# Altium footprint library Connector.PcbLib: 114 footprints (part 7 of 8)
Each footprint in its own frame and in the unit in brackets; x right, y up, seen from the top. Pads: shape width x height; smd on the part's side, far side on the other; paste and mask are expansions set on the pad; w line width, h text height; cw(c..) or ccw(c..) is an arc to the next point about the centre after c.
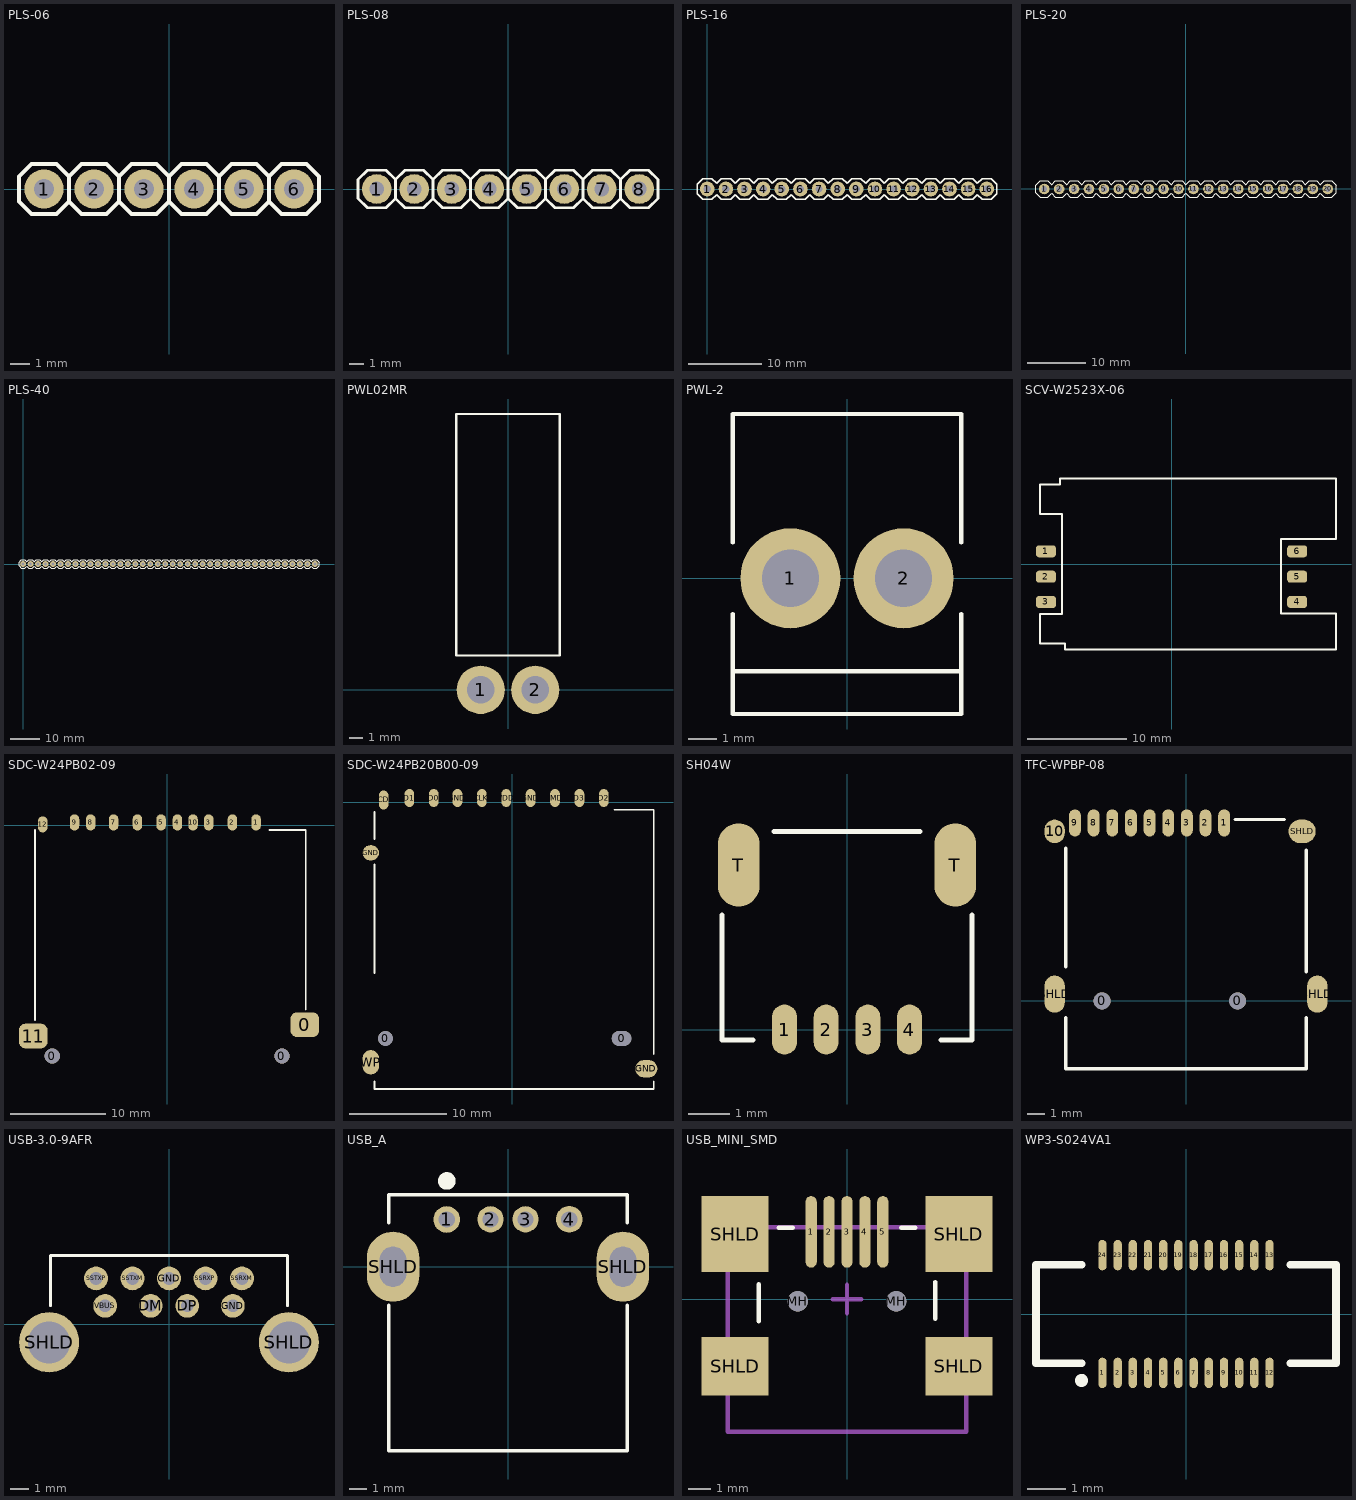
[diagram p6: the footprints below, top view; thin cyan lines are the x and y axes]

## PLS-06 [mm]
pads (6):
  round 2 hole 1: 1(-6.35,0) 2(-3.81,0) 3(-1.27,0) 4(1.27,0) 5(3.81,0) 6(6.35,0)
Top Overlay:
  lines w0.2: -5.08,-0.635 -4.445,-1.27 -3.175,-1.27 -2.54,-0.635 ; -5.08,-0.635 -5.08,0.635 ; -5.08,-0.635 -5.715,-1.27 -6.985,-1.27 -7.62,-0.635 -7.62,0.635 -6.985,1.27 -5.715,1.27 -5.08,0.635 ; -5.08,0.635 -4.445,1.27 -3.175,1.27 -2.54,0.635 ; -2.54,-0.635 -1.905,-1.27 -0.635,-1.27 0,-0.635 ; -2.54,-0.635 -2.54,0.635 ; -2.54,0.635 -1.905,1.27 -0.635,1.27 0,0.635 ; 0,-0.635 0.635,-1.27 1.905,-1.27 2.54,-0.635 ; 0,-0.635 0,0.635 ; 0,0.635 0.635,1.27 1.905,1.27 2.54,0.635 ; 2.54,-0.635 3.175,-1.27 4.445,-1.27 5.08,-0.635 ; 2.54,-0.635 2.54,0.635 ; 2.54,0.635 3.175,1.27 4.445,1.27 5.08,0.635 ; 5.08,-0.635 5.08,0.635 ; 5.08,-0.635 5.715,-1.27 6.985,-1.27 7.62,-0.635 7.62,0.635 6.985,1.27 5.715,1.27 5.08,0.635
3D body "PLS-06.STEP": height 8.45, standoff -2.99, extent -7.62,-1.27 7.62,1.27

## PLS-08 [mm]
pads (8):
  round 2 hole 1: 1(-8.89,0) 2(-6.35,0) 3(-3.81,0) 4(-1.27,0) 5(1.27,0) 6(3.81,0) 7(6.35,0) 8(8.89,0)
Top Overlay:
  lines w0.2: -7.62,-0.635 -6.985,-1.27 -5.715,-1.27 -5.08,-0.635 ; -7.62,-0.635 -7.62,0.635 ; -7.62,-0.635 -8.255,-1.27 -9.525,-1.27 -10.16,-0.635 -10.16,0.635 -9.525,1.27 -8.255,1.27 -7.62,0.635 ; -7.62,0.635 -6.985,1.27 -5.715,1.27 -5.08,0.635 ; -5.08,-0.635 -4.445,-1.27 -3.175,-1.27 -2.54,-0.635 ; -5.08,-0.635 -5.08,0.635 ; -5.08,0.635 -4.445,1.27 -3.175,1.27 -2.54,0.635 ; -2.54,-0.635 -1.905,-1.27 -0.635,-1.27 0,-0.635 ; -2.54,-0.635 -2.54,0.635 ; -2.54,0.635 -1.905,1.27 -0.635,1.27 0,0.635 ; 0,-0.635 0.635,-1.27 1.905,-1.27 2.54,-0.635 ; 0,-0.635 0,0.635 ; 0,0.635 0.635,1.27 1.905,1.27 2.54,0.635 ; 2.54,-0.635 2.54,0.635 ; 2.54,-0.635 3.175,-1.27 4.445,-1.27 5.08,-0.635 ; 2.54,0.635 3.175,1.27 4.445,1.27 5.08,0.635 ; 5.08,-0.635 5.715,-1.27 6.985,-1.27 7.62,-0.635 ; 5.08,-0.635 5.08,0.635 ; 5.08,0.635 5.715,1.27 6.985,1.27 7.62,0.635 ; 7.62,-0.635 8.255,-1.27 9.525,-1.27 10.16,-0.635 10.16,0.635 9.525,1.27 8.255,1.27 7.62,0.635 ; 7.62,-0.635 7.62,0.635

## PLS-16 [mm]
pads (16):
  round 2 hole 1: 1(0,0) 2(2.54,0) 3(5.08,0) 4(7.62,0) 5(10.16,0) 6(12.7,0) 7(15.24,0) 8(17.78,0) 9(20.32,0) 10(22.86,0) 11(25.4,0) 12(27.94,0) 13(30.48,0) 14(33.02,0) 15(35.56,0) 16(38.1,0)
Top Overlay:
  lines w0.2: -1.397,-0.635 -1.397,0.635 -0.635,1.397 0.635,1.397 1.27,0.762 1.905,1.397 3.175,1.397 3.81,0.762 4.445,1.397 5.715,1.397 6.35,0.762 6.985,1.397 8.255,1.397 8.89,0.762 9.525,1.397 10.795,1.397 11.43,0.762 12.065,1.397 13.335,1.397 13.97,0.762 14.605,1.397 15.875,1.397 16.51,0.762 17.145,1.397 18.415,1.397 19.05,0.762 19.685,1.397 20.955,1.397 21.59,0.762 22.225,1.397 23.495,1.397 24.13,0.762 24.765,1.397 26.035,1.397 26.67,0.762 27.305,1.397 28.575,1.397 29.21,0.762 29.845,1.397 31.115,1.397 31.75,0.762 32.385,1.397 33.655,1.397 34.29,0.762 34.925,1.397 36.195,1.397 36.83,0.762 37.465,1.397 38.735,1.397 39.497,0.635 39.497,-0.635 38.735,-1.397 37.465,-1.397 36.83,-0.762 36.195,-1.397 34.925,-1.397 34.29,-0.762 33.655,-1.397 32.385,-1.397 31.75,-0.762 31.115,-1.397 29.845,-1.397 29.21,-0.762 28.575,-1.397 27.305,-1.397 26.67,-0.762 26.035,-1.397 24.765,-1.397 24.13,-0.762 23.495,-1.397 22.225,-1.397 21.59,-0.762 20.955,-1.397 19.685,-1.397 19.05,-0.762 18.415,-1.397 17.145,-1.397 16.51,-0.762 15.875,-1.397 14.605,-1.397 13.97,-0.762 13.335,-1.397 12.065,-1.397 11.43,-0.762 10.795,-1.397 9.525,-1.397 8.89,-0.762 8.255,-1.397 6.985,-1.397 6.35,-0.762 5.715,-1.397 4.445,-1.397 3.81,-0.762 3.175,-1.397 1.905,-1.397 1.27,-0.762 0.635,-1.397 -0.635,-1.397 -1.397,-0.635
3D body "PLS-16.STEP": height 8.55, standoff -2.99, extent -1.27,-1.245 39.37,1.245

## PLS-20 [mm]
pads (20):
  round 1.8 hole 1: 1(-24.13,0) 2(-21.59,0) 3(-19.05,0) 4(-16.51,0) 5(-13.97,0) 6(-11.43,0) 7(-8.89,0) 8(-6.35,0) 9(-3.81,0) 10(-1.27,0) 11(1.27,0) 12(3.81,0) 13(6.35,0) 14(8.89,0) 15(11.43,0) 16(13.97,0) 17(16.51,0) 18(19.05,0) 19(21.59,0) 20(24.13,0)
Top Overlay:
  lines w0.2: -25.527,-0.635 -24.765,-1.397 -23.495,-1.397 -22.86,-0.762 -22.225,-1.397 -20.955,-1.397 -20.32,-0.762 -19.685,-1.397 -18.415,-1.397 -17.78,-0.762 -17.145,-1.397 -15.875,-1.397 -15.24,-0.762 -14.605,-1.397 -13.335,-1.397 -12.7,-0.762 -12.065,-1.397 -10.795,-1.397 -10.16,-0.762 -9.525,-1.397 -8.255,-1.397 -7.62,-0.762 -6.985,-1.397 -5.715,-1.397 -5.08,-0.762 -4.445,-1.397 -3.175,-1.397 -2.54,-0.762 -1.905,-1.397 -0.635,-1.397 0,-0.762 0.635,-1.397 1.905,-1.397 2.54,-0.762 3.175,-1.397 4.445,-1.397 5.08,-0.762 5.715,-1.397 6.985,-1.397 7.62,-0.762 8.255,-1.397 9.525,-1.397 10.16,-0.762 10.795,-1.397 12.065,-1.397 12.7,-0.762 13.335,-1.397 14.605,-1.397 15.24,-0.762 15.875,-1.397 17.145,-1.397 17.78,-0.762 18.415,-1.397 19.685,-1.397 20.32,-0.762 20.955,-1.397 22.225,-1.397 22.86,-0.762 23.495,-1.397 24.765,-1.397 25.527,-0.635 25.527,0.635 24.765,1.397 23.495,1.397 22.86,0.762 22.225,1.397 20.955,1.397 20.32,0.762 19.685,1.397 18.415,1.397 17.78,0.762 17.145,1.397 15.875,1.397 15.24,0.762 14.605,1.397 13.335,1.397 12.7,0.762 12.065,1.397 10.795,1.397 10.16,0.762 9.525,1.397 8.255,1.397 7.62,0.762 6.985,1.397 5.715,1.397 5.08,0.762 4.445,1.397 3.175,1.397 2.54,0.762 1.905,1.397 0.635,1.397 0,0.762 -0.635,1.397 -1.905,1.397 -2.54,0.762 -3.175,1.397 -4.445,1.397 -5.08,0.762 -5.715,1.397 -6.985,1.397 -7.62,0.762 -8.255,1.397 -9.525,1.397 -10.16,0.762 -10.795,1.397 -12.065,1.397 -12.7,0.762 -13.335,1.397 -14.605,1.397 -15.24,0.762 -15.875,1.397 -17.145,1.397 -17.78,0.762 -18.415,1.397 -19.685,1.397 -20.32,0.762 -20.955,1.397 -22.225,1.397 -22.86,0.762 -23.495,1.397 -24.765,1.397 -25.527,0.635 -25.527,-0.635

## PLS-40 [mm]
pads (40):
  round 2 hole 1: 1(0,0) 2(2.54,0) 3(5.08,0) 4(7.62,0) 5(10.16,0) 6(12.7,0) 7(15.24,0) 8(17.78,0) 9(20.32,0) 10(22.86,0) 11(25.4,0) 12(27.94,0) 13(30.48,0) 14(33.02,0) 15(35.56,0) 16(38.1,0) 17(40.64,0) 18(43.18,0) 19(45.72,0) 20(48.26,0) 21(50.8,0) 22(53.34,0) 23(55.88,0) 24(58.42,0) 25(60.96,0) 26(63.5,0) 27(66.04,0) 28(68.58,0) 29(71.12,0) 30(73.66,0) 31(76.2,0) 32(78.74,0) 33(81.28,0) 34(83.82,0) 35(86.36,0) 36(88.9,0) 37(91.44,0) 38(93.98,0) 39(96.52,0) 40(99.06,0)
Top Overlay:
  drawing of 242 lines, arcs and shapes, not listed

## PWL02MR [mm]
pads (2):
  round 3.5 hole 2: 1(-1.98,0) 2(1.98,0)
Top Overlay:
  lines w0.15: -3.75,2.5 3.75,2.5 3.75,20 -3.75,20 -3.75,2.5
3D body "026615020.stp": height 10.02, standoff -3.95, extent -3.886,-0.6 3.886,20.114

## PWL-2 [mm]
pads (2):
  round 3.5 hole 2: 1(-1.98,0) 2(1.98,0)
Top Overlay:
  lines w0.15: -4,-3.25 4,-3.25 ; -4,-1.25 -4,-4.75 4,-4.75 4,-1.25 ; -4,1.25 -4,5.75 4,5.75 4,1.25
3D body "User Library-PWL-2.step": height 13.81, standoff -3.59, extent -3.94,-4.8 3.98,5.6

## SCV-W2523X-06 [mm]
pads (6):
  rrect50% 2x1.2 smd: 1(-12.6,1.27) 2(-12.6,-1.27) 3(-12.6,-3.81) 4(12.6,-3.81) 5(12.6,-1.27) 6(12.6,1.27)
Top Overlay:
  lines w0.2: -13.2,-8 -10.668,-8 -10.668,-8.6 16.5,-8.6 16.5,-4.953 11,-4.953 11,2.5 16.5,2.5 16.5,8.6 -11.2,8.6 -11.2,8 -13.2,8 -13.2,5 -11,5 -11,-5 -13.2,-5 -13.2,-8
3D body: height 2.3, standoff 0, extent -13.2,-8.6 16.5,8.6

## SDC-W24PB02-09 [mm]
pads (15):
  round 1.6 hole 1.6 unplated mask+0: 0(-12.1,-24.3) 0(12.1,-24.3)
  rrect50% 3x2.6 smd mask+0.1: 0(14.5,-21) 11(-14.1,-22.2)
  oval 1x1.7 smd mask+0.1: 1(9.38,0.3) 2(6.88,0.3) 3(4.38,0.3) 4(1.08,0.3) 5(-0.63,0.3) 6(-3.13,0.3) 7(-5.63,0.3) 8(-8.05,0.3) 9(-9.75,0.3) 10(2.73,0.3) 12(-13.1,0.1)
Top Overlay:
  lines w0.2: -13.9,-20.5 -13.9,-0.5 ; 10.8,-0.5 14.6,-0.5 14.6,-19.4
3D body "SDC-W24PB02-09.STEP": height 2.77, standoff -0.98, extent -14.2,-35.75 15,0.25

## SDC-W24PB20B00-09 [mm]
pads (15):
  round 1.5 hole 1.5 unplated mask+0: 0(-13,-24.195)
  oval 2x1.5 hole 1.5 slot 2 at 0 deg unplated mask+0: 0(11.2,-24.195)
  oval 1x1.95 smd mask+0.1: CD(-13.18,0.25)
  oval 1x1.85 smd mask+0.1: CLK(-3.12,0.45) CMD(4.38,0.45) D0(-8.05,0.45) D1(-10.55,0.45) D2(9.38,0.45) D3(6.88,0.45) GND(-5.62,0.45) GND(1.88,0.45) VDD(-0.62,0.45)
  oval 1.7x1.55 smd mask+0.1: GND(-14.5,-5.165)
  oval 2.25x1.8 smd mask+0.1: GND(13.75,-27.3)
  oval 1.7x2.5 smd mask+0.1: WP(-14.5,-26.64)
Top Overlay:
  lines w0.2: -14.125,-28.6 -14.125,-29.375 14.5,-29.375 14.5,-28.6 ; -14.125,-17.5 -14.125,-6.375 ; -14.125,-3.75 -14.125,-1 ; 10.5,-0.75 14.5,-0.75 14.5,-25.8
3D body "SDC-W24PB20B-09.STEP": height 2.77, standoff -0.63, extent -14.47,-36.125 14.43,0.875

## SH04W [mm]
pads (6):
  oval 0.6x1.2 smd: 1(-1.5,0) 2(-0.5,0) 3(0.5,0) 4(1.5,0)
  oval 1x2 smd: T(-2.6,3.95) T(2.6,3.95)
Top Overlay:
  lines w0.12: -3,2.75 -3,-0.25 -2.25,-0.25 ; -1.75,4.75 1.75,4.75 ; 2.25,-0.25 3,-0.25 3,2.75
3D body "User Library-sh04w_asm.STEP": height 3.15, standoff 0.01, extent -3,-0.23 3,4.73

## TFC-WPBP-08 [mm]
height 1.85
pads (15):
  round 1 hole 1 unplated mask+0.1: 0(-4.95,0) 0(3.05,0)
  oval 0.7x1.6 smd mask+0.1: 1(2.25,10.5) 2(1.15,10.5) 3(0.05,10.5) 4(-1.05,10.5) 5(-2.15,10.5) 6(-3.25,10.5) 7(-4.35,10.5) 8(-5.45,10.5) 9(-6.55,10.5)
  oval 1.2x1.4 smd mask+0.1: 10(-7.75,10)
  oval 1.2x2.2 smd mask+0.1: SHLD(-7.75,0.4) SHLD(7.75,0.4)
  oval 1.6x1.4 smd mask+0.1: SHLD(6.85,10)
Top Overlay:
  lines w0.2: -7.1,-1 -7.1,-4 7.1,-4 7.1,-1 ; -7.1,2 -7.1,9 ; 2.9,10.7 5.8,10.7 ; 7.1,1.7 7.1,8.9
3D body "TFC-WPBP-08.STEP": height 1.87, standoff -0.58, extent -7.075,-6.2 7.075,10.7

## USB-3.0-9AFR [mm]
pads (11):
  round 1.3 hole 0.7: DM(-1,1) DP(1,1) GND(0,2.5) GND(3.5,1) SSRXM(4,2.5) SSRXP(2,2.5) SSTXM(-2,2.5) SSTXP(-4,2.5) VBUS(-3.5,1)
  round 3.3 hole 2.3: SHLD(-6.57,-1) SHLD(6.57,-1)
Top Overlay:
  lines w0.15: -6.5,1 -6.5,3.75 6.5,3.75 6.5,1
3D body "STEP-692121030100-rev1.stp": height 8, standoff -3.22, extent -7.74,-12.8 7.74,3.75

## USB_A [mm]
pads (6):
  round 1.524 hole 0.92 mask+0: 1(-3.5,2.7) 4(3.5,2.71)
  round 1.5 hole 0.92 mask+0: 2(-1,2.71) 3(1,2.71)
  oval 3x4 hole 1.5 slot 2.3 at 90 deg mask+0: SHLD(-6.57,0) SHLD(6.57,0)
Top Overlay:
  circle w0.6: c-3.5,4.9 r0.2
  lines w0.2: -6.8,-2.2 -6.8,-10.5 6.8,-10.5 6.8,-2.2 ; -6.8,2.5 -6.8,4.1 6.8,4.1 6.8,2.5
3D body "USB-A.STEP": height 6.97, standoff -4.18, extent -7.915,-10.516 7.885,3.184

## USB_MINI_SMD [mm]
pads (11):
  oval 0.5x3.2 smd: 1(-1.6,3) 2(-0.8,3) 3(0,3) 4(0.8,3) 5(1.6,3)
  round 0.9 hole 0.9 unplated: MH(-2.2,-0.1) MH(2.2,-0.1)
  rect 3x2.6 smd: SHLD(-5,-3) SHLD(5,-3)
  rect 3x3.4 smd: SHLD(-5,2.9) SHLD(5,2.9)
Top Overlay:
  lines w0.2: -3.937,-0.982 -3.937,0.669 ; -3.048,3.175 -2.413,3.175 ; 2.413,3.175 3.048,3.175 ; 3.937,-0.889 3.937,0.762
Mechanical 13:
  lines w0.2: -5.334,-5.935 -5.334,3.209 5.334,3.209 5.334,-5.935 -5.334,-5.935
Mechanical 15:
  lines w0.2: -0.635,0 0.635,0 ; 0,-0.635 0,0.635
3D body "SB_mini_B.step": height 3.95, standoff -1, extent -5.35,-5.973 5.35,3.227

## WP3-S024VA1 [mm]
pads (24):
  oval 0.22x0.8 smd: 1(-2.2,-1.55) 2(-1.8,-1.55) 3(-1.4,-1.55) 4(-1,-1.55) 5(-0.6,-1.55) 6(-0.2,-1.55) 7(0.2,-1.55) 8(0.6,-1.55) 9(1,-1.55) 10(1.4,-1.55) 11(1.8,-1.55) 12(2.2,-1.55) 13(2.2,1.55) 14(1.8,1.55) 15(1.4,1.55) 16(1,1.55) 17(0.6,1.55) 18(0.2,1.55) 19(-0.2,1.55) 20(-0.6,1.55) 21(-1,1.55) 22(-1.4,1.55) 23(-1.8,1.55) 24(-2.2,1.55)
Top Overlay:
  circle w0.2: c-2.75,-1.75 r0.071
  lines w0.2: -2.75,-1.3 -3.95,-1.3 -3.95,1.3 -2.75,1.3 ; 2.75,-1.3 3.95,-1.3 3.95,1.3 2.75,1.3
3D body "5024262430.stp": height 0.99, standoff -0.01, extent -3.95,-1.3 3.95,1.3